# Altium footprint library heromap.PcbLib: 593 footprints (part 9 of 38)
Each footprint in its own frame and in the unit in brackets; x right, y up, seen from the top. Pads: shape width x height; smd on the part's side, far side on the other; paste and mask are expansions set on the pad; w line width, h text height; cw(c..) or ccw(c..) is an arc to the next point about the centre after c.
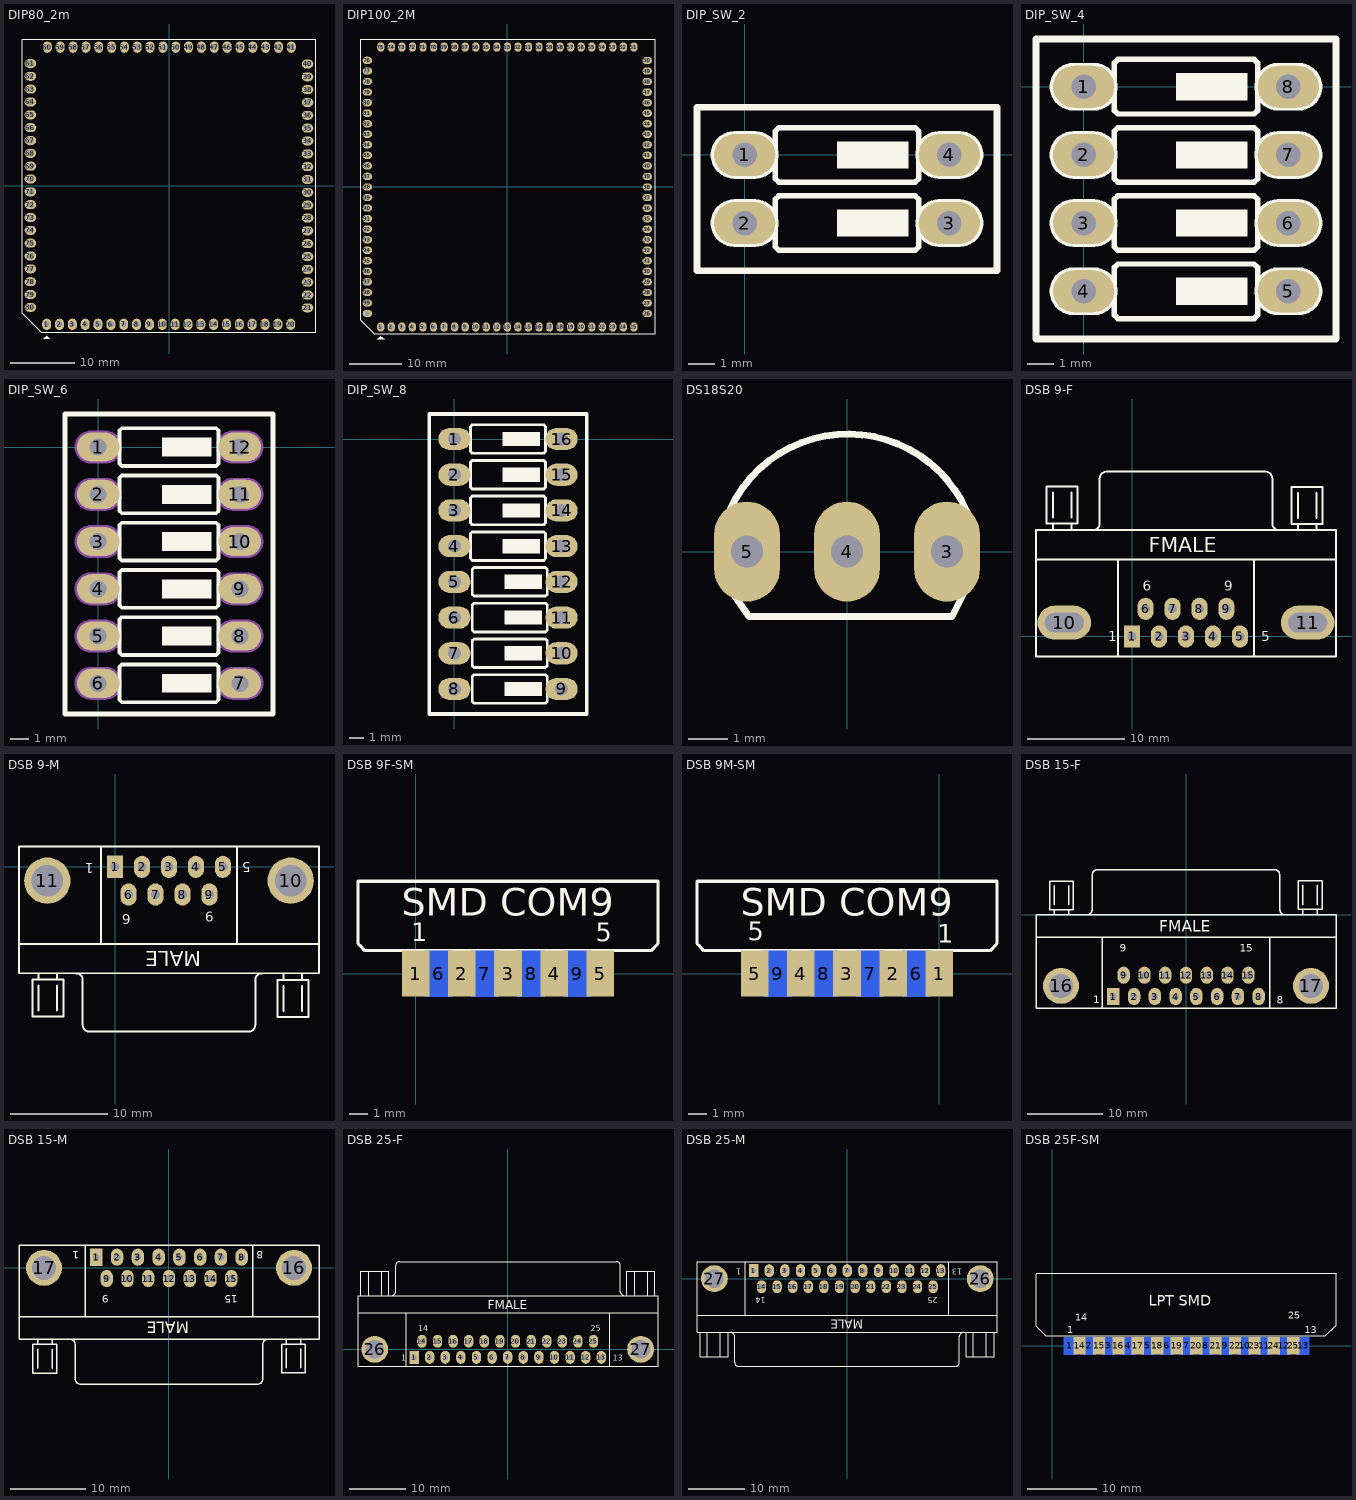
[diagram p8: the footprints below, top view; thin cyan lines are the x and y axes]

## DIP80_2m [mil] "DIP80, P - P 200"
pads (80):
  oval 55x70 hole 35: 1(-750,-850) 2(-671.26,-850) 3(-592.52,-850) 4(-513.78,-850) 5(-435.04,-850) 6(-356.3,-850) 7(-277.56,-850) 8(-198.82,-850) 9(-120.08,-850) 10(-41.34,-850) 11(37.4,-850) 12(116.14,-850) 13(194.88,-850) 14(273.62,-850) 15(352.36,-850) 16(431.1,-850) 17(509.84,-850) 18(588.58,-850) 19(667.32,-850) 20(746.06,-850) 41(750,850) 42(671.26,850) 43(592.52,850) 44(513.78,850) 45(435.04,850) 46(356.3,850) 47(277.56,850) 48(198.82,850) 49(120.08,850) 50(41.34,850) 51(-37.4,850) 52(-116.14,850) 53(-194.88,850) 54(-273.62,850) 55(-352.36,850) 56(-431.1,850) 57(-509.84,850) 58(-588.58,850) 59(-667.32,850) 60(-746.06,850)
  oval 70x55 hole 35: 21(850,-749) 22(850,-670.26) 23(850,-591.52) 24(850,-512.78) 25(850,-434.04) 26(850,-355.3) 27(850,-276.56) 28(850,-197.82) 29(850,-119.08) 30(850,-40.34) 31(850,38.4) 32(850,117.14) 33(850,195.88) 34(850,274.62) 35(850,353.36) 36(850,432.1) 37(850,510.84) 38(850,589.58) 39(850,668.32) 40(850,747.06) 61(-850,750) 62(-850,671.26) 63(-850,592.52) 64(-850,513.78) 65(-850,435.04) 66(-850,356.3) 67(-850,277.56) 68(-850,198.82) 69(-850,120.08) 70(-850,41.34) 71(-850,-37.4) 72(-850,-116.14) 73(-850,-194.88) 74(-850,-273.62) 75(-850,-352.36) 76(-850,-431.1) 77(-850,-509.84) 78(-850,-588.58) 79(-850,-667.32) 80(-850,-746.06)
Top Overlay:
  region: -770,-940 -750,-920 -730,-940
  lines w7: -900,-783 -783,-900 900,-900 900,900 -900,900 -900,-783

## DIP100_2M [mil] "DIP100 - P-P 2mm"
pads (100):
  oval 55x70 hole 35: 1(-945,-1045) 2(-866.26,-1045) 3(-787.52,-1045) 4(-708.78,-1045) 5(-630.04,-1045) 6(-551.3,-1045) 7(-472.56,-1045) 8(-393.82,-1045) 9(-315.08,-1045) 10(-236.34,-1045) 11(-157.6,-1045) 12(-78.86,-1045) 13(-0.12,-1045) 14(78.62,-1045) 15(157.36,-1045) 16(236.1,-1045) 17(314.84,-1045) 18(393.58,-1045) 19(472.32,-1045) 20(551.06,-1045) 21(629.8,-1045) 22(708.54,-1045) 23(787.28,-1045) 24(866.02,-1045) 25(944.76,-1045) 51(945,1045) 52(866.26,1045) 53(787.52,1045) 54(708.78,1045) 55(630.04,1045) 56(551.3,1045) 57(472.56,1045) 58(393.82,1045) 59(315.08,1045) 60(236.34,1045) 61(157.6,1045) 62(78.86,1045) 63(0.12,1045) 64(-78.62,1045) 65(-157.36,1045) 66(-236.1,1045) 67(-314.84,1045) 68(-393.58,1045) 69(-472.32,1045) 70(-551.06,1045) 71(-629.8,1045) 72(-708.54,1045) 73(-787.28,1045) 74(-866.02,1045) 75(-944.76,1045)
  oval 70x55 hole 35: 26(1045,-945) 27(1045,-866.26) 28(1045,-787.52) 29(1045,-708.78) 30(1045,-630.04) 31(1045,-551.3) 32(1045,-472.56) 33(1045,-393.82) 34(1045,-315.08) 35(1045,-236.34) 36(1045,-157.6) 37(1045,-78.86) 38(1045,-0.12) 39(1045,78.62) 40(1045,157.36) 41(1045,236.1) 42(1045,314.84) 43(1045,393.58) 44(1045,472.32) 45(1045,551.06) 46(1045,629.8) 47(1045,708.54) 48(1045,787.28) 49(1045,866.02) 50(1045,944.76) 76(-1045,945) 77(-1045,866.26) 78(-1045,787.52) 79(-1045,708.78) 80(-1045,630.04) 81(-1045,551.3) 82(-1045,472.56) 83(-1045,393.82) 84(-1045,315.08) 85(-1045,236.34) 86(-1045,157.6) 87(-1045,78.86) 88(-1045,0.12) 89(-1045,-78.62) 90(-1045,-157.36) 91(-1045,-236.1) 92(-1045,-314.84) 93(-1045,-393.58) 94(-1045,-472.32) 95(-1045,-551.06) 96(-1045,-629.8) 97(-1045,-708.54) 98(-1045,-787.28) 99(-1045,-866.02) 100(-1045,-944.76)
Top Overlay:
  region: -945,-1115 -975,-1135 -915,-1135
  lines w7: -1095,-995 -995,-1095 1105,-1095 1105,1105 -1095,1105 -1095,-995

## DIP_SW_2 [mil]
pads (4):
  oval 90x62 hole 36: 1(0,0) 2(0,-100) 3(300,-100) 4(300,0)
Top Overlay:
  rectangle: 135,-120 240,-80
  rectangle: 135,-20 240,20
  lines w8: 55,-140 245,-140 250,-140 255,-135 255,-65 250,-60 55,-60 ; 55,-40 245,-40 250,-40 255,-35 255,35 250,40 55,40 ; 65,-60 55,-60 ; 65,40 55,40 ; 100,-140 50,-140 45,-135 45,-65 50,-60 55,-60 ; 100,-40 50,-40 45,-35 45,35 50,40 55,40
  lines w10: -70,-170 370,-170 370,70 -70,70 -70,-170 ; -15,-130 cw(c-15,-100) -15,-70 15,-70 cw(c15,-100) 15,-130 -15,-130 ; -15,-30 cw(c-15,0) -15,30 15,30 cw(c15,0) 15,-30 -15,-30 ; 285,-130 cw(c285,-100) 285,-70 315,-70 cw(c315,-100) 315,-130 285,-130 ; 285,-30 cw(c285,0) 285,30 315,30 cw(c315,0) 315,-30 285,-30

## DIP_SW_4 [mil]
pads (8):
  oval 90x62 hole 36: 1(0,0) 2(0,-100) 3(0,-200) 4(0,-300) 5(300,-300) 6(300,-200) 7(300,-100) 8(300,0)
Top Overlay:
  rectangle: 135,-20 240,20
  rectangle: 135,-120 240,-80
  rectangle: 135,-220 240,-180
  rectangle: 135,-320 240,-280
  lines w8: 55,-340 245,-340 250,-340 255,-335 255,-265 250,-260 55,-260 ; 55,-240 245,-240 250,-240 255,-235 255,-165 250,-160 55,-160 ; 55,-140 245,-140 250,-140 255,-135 255,-65 250,-60 55,-60 ; 55,-40 245,-40 250,-40 255,-35 255,35 250,40 55,40 ; 65,-260 55,-260 ; 65,-160 55,-160 ; 65,-60 55,-60 ; 65,40 55,40 ; 100,-340 50,-340 45,-335 45,-265 50,-260 55,-260 ; 100,-240 50,-240 45,-235 45,-165 50,-160 55,-160 ; 100,-140 50,-140 45,-135 45,-65 50,-60 55,-60 ; 100,-40 50,-40 45,-35 45,35 50,40 55,40
  lines w10: -70,-370 -70,70 370,70 370,-370 -70,-370 ; -15,-330 cw(c-15,-300) -15,-270 15,-270 cw(c15,-300) 15,-330 -15,-330 ; -15,-230 cw(c-15,-200) -15,-170 15,-170 cw(c15,-200) 15,-230 -15,-230 ; -15,-130 cw(c-15,-100) -15,-70 15,-70 cw(c15,-100) 15,-130 -15,-130 ; -15,-30 cw(c-15,0) -15,30 15,30 cw(c15,0) 15,-30 -15,-30 ; 285,-330 cw(c285,-300) 285,-270 315,-270 cw(c315,-300) 315,-330 285,-330 ; 285,-230 cw(c285,-200) 285,-170 315,-170 cw(c315,-200) 315,-230 285,-230 ; 285,-130 cw(c285,-100) 285,-70 315,-70 cw(c315,-100) 315,-130 285,-130 ; 285,-30 cw(c285,0) 285,30 315,30 cw(c315,0) 315,-30 285,-30

## DIP_SW_6 [mil]
pads (12):
  oval 90x62 hole 36: 1(0,0) 2(0,-100) 3(0,-200) 4(0,-300) 5(0,-400) 6(0,-500) 7(300,-500) 8(300,-400) 9(300,-300) 10(300,-200) 11(300,-100) 12(300,0)
Top Overlay:
  rectangle: 135,-20 240,20
  rectangle: 135,-120 240,-80
  rectangle: 135,-220 240,-180
  rectangle: 135,-320 240,-280
  rectangle: 135,-420 240,-380
  rectangle: 135,-520 240,-480
  lines w8: 55,-540 245,-540 250,-540 255,-535 255,-465 250,-460 55,-460 ; 55,-440 245,-440 250,-440 255,-435 255,-365 250,-360 55,-360 ; 55,-340 245,-340 250,-340 255,-335 255,-265 250,-260 55,-260 ; 55,-240 245,-240 250,-240 255,-235 255,-165 250,-160 55,-160 ; 55,-140 245,-140 250,-140 255,-135 255,-65 250,-60 55,-60 ; 55,-40 245,-40 250,-40 255,-35 255,35 250,40 55,40 ; 65,-460 55,-460 ; 65,-360 55,-360 ; 65,-260 55,-260 ; 65,-160 55,-160 ; 65,-60 55,-60 ; 65,40 55,40 ; 100,-540 50,-540 45,-535 45,-465 50,-460 55,-460 ; 100,-440 50,-440 45,-435 45,-365 50,-360 55,-360 ; 100,-340 50,-340 45,-335 45,-265 50,-260 55,-260 ; 100,-240 50,-240 45,-235 45,-165 50,-160 55,-160 ; 100,-140 50,-140 45,-135 45,-65 50,-60 55,-60 ; 100,-40 50,-40 45,-35 45,35 50,40 55,40
  lines w10: -70,-565 -70,-370 -70,70 370,70 370,-370 370,-565 360,-565 -70,-565
Mechanical 3:
  lines w10: -15,-530 cw(c-15,-500) -15,-470 15,-470 cw(c15,-500) 15,-530 -15,-530 ; -15,-430 cw(c-15,-400) -15,-370 15,-370 cw(c15,-400) 15,-430 -15,-430 ; -15,-330 cw(c-15,-300) -15,-270 15,-270 cw(c15,-300) 15,-330 -15,-330 ; -15,-230 cw(c-15,-200) -15,-170 15,-170 cw(c15,-200) 15,-230 -15,-230 ; -15,-130 cw(c-15,-100) -15,-70 15,-70 cw(c15,-100) 15,-130 -15,-130 ; -15,-30 cw(c-15,0) -15,30 15,30 cw(c15,0) 15,-30 -15,-30 ; 285,-530 cw(c285,-500) 285,-470 315,-470 cw(c315,-500) 315,-530 285,-530 ; 285,-430 cw(c285,-400) 285,-370 315,-370 cw(c315,-400) 315,-430 285,-430 ; 285,-330 cw(c285,-300) 285,-270 315,-270 cw(c315,-300) 315,-330 285,-330 ; 285,-230 cw(c285,-200) 285,-170 315,-170 cw(c315,-200) 315,-230 285,-230 ; 285,-130 cw(c285,-100) 285,-70 315,-70 cw(c315,-100) 315,-130 285,-130 ; 285,-30 cw(c285,0) 285,30 315,30 cw(c315,0) 315,-30 285,-30

## DIP_SW_8 [mil]
pads (16):
  oval 90x62 hole 36: 1(0,0) 2(0,-100) 3(0,-200) 4(0,-300) 5(0,-400) 6(0,-500) 7(0,-600) 8(0,-700) 9(300,-700) 10(300,-600) 11(300,-500) 12(300,-400) 13(300,-300) 14(300,-200) 15(300,-100) 16(300,0)
Top Overlay:
  rectangle: 135,-320 240,-280
  rectangle: 135,-220 240,-180
  rectangle: 135,-120 240,-80
  rectangle: 135,-20 240,20
  rectangle: 140,-720 245,-680
  rectangle: 140,-620 245,-580
  rectangle: 140,-520 245,-480
  rectangle: 140,-420 245,-380
  lines w8: 55,-340 245,-340 250,-340 255,-335 255,-265 250,-260 55,-260 ; 55,-240 245,-240 250,-240 255,-235 255,-165 250,-160 55,-160 ; 55,-140 245,-140 250,-140 255,-135 255,-65 250,-60 55,-60 ; 55,-40 245,-40 250,-40 255,-35 255,35 250,40 55,40 ; 60,-740 250,-740 255,-740 260,-735 260,-665 255,-660 60,-660 ; 60,-640 250,-640 255,-640 260,-635 260,-565 255,-560 60,-560 ; 60,-540 250,-540 255,-540 260,-535 260,-465 255,-460 60,-460 ; 60,-440 250,-440 255,-440 260,-435 260,-365 255,-360 60,-360 ; 65,-260 55,-260 ; 65,-160 55,-160 ; 65,-60 55,-60 ; 65,40 55,40 ; 70,-660 60,-660 ; 70,-560 60,-560 ; 70,-460 60,-460 ; 70,-360 60,-360 ; 100,-340 50,-340 45,-335 45,-265 50,-260 55,-260 ; 100,-240 50,-240 45,-235 45,-165 50,-160 55,-160 ; 100,-140 50,-140 45,-135 45,-65 50,-60 55,-60 ; 100,-40 50,-40 45,-35 45,35 50,40 55,40 ; 105,-740 55,-740 50,-735 50,-665 55,-660 60,-660 ; 105,-640 55,-640 50,-635 50,-565 55,-560 60,-560 ; 105,-540 55,-540 50,-535 50,-465 55,-460 60,-460 ; 105,-440 55,-440 50,-435 50,-365 55,-360 60,-360
  lines w10: -70,-370 -70,70 370,70 370,-370 ; -70,-330 -70,-770 370,-770 370,-330

## DS18S20 [mil] "TO-92"
height 200
pads (3):
  oval 66x100 hole 32: 3(100,0) 4(0,0) 5(-100,0)
Top Overlay:
  lines w7: -116.52,43.21 cw(c0.97,-12.43) 119.94,39.97 ; -115.34,-40.24 -98,-65 105,-65 118,-39

## DSB 9-F [mil] "COM FMALE - D Subminiature; 9 Position; Right Angle; Pitch 1.385 mm"
height 501.97
pads (11):
  rect 65x90 hole 35: 1(0,0)
  oval 65x90 hole 35: 2(109.06,0) 3(218.11,0) 4(327.17,0) 5(436.22,0) 6(54.53,111.81) 7(163.58,111.81) 8(272.64,111.81) 9(381.69,111.81)
  oval 216.54x137.8 hole 78.74 slot 157.48 at 0 deg: 10(-273.82,55.91) 11(710.04,55.91)
Top Overlay:
  lines w7.87: -388.19,311.81 824.41,311.81 ; -158.27,430.12 ccw(c-158.27,457.48) -130.91,457.48 -130.91,638.58 ; -130.71,638.78 cw(c-103.35,638.78) -103.35,666.14 539.57,666.14 cw(c539.57,638.78) 566.93,638.78 ; -57.48,-80.09 -57.48,311.81 ; 493.7,-78.09 493.7,311.81 ; 567.13,638.58 567.13,457.48 ccw(c594.49,457.48) 594.49,430.12 ; -388.19,-80.09 -388.19,429.92 824.41,429.92 824.41,-80.09 -388.19,-80.09
  lines w8: -319.89,431.92 -319.89,456.92 ; -319.89,481.92 -319.89,581.92 ; -244.89,431.92 -244.89,456.92 ; -244.89,481.92 -244.89,581.92 ; 670.11,429.92 670.11,454.92 ; 670.11,479.92 670.11,579.92 ; 745.11,429.92 745.11,454.92 ; 745.11,479.92 745.11,579.92 ; -344.89,456.92 -219.89,456.92 -219.89,606.92 -344.89,606.92 -344.89,456.92 ; 645.11,454.92 770.11,454.92 770.11,604.92 645.11,604.92 645.11,454.92
  text "1" at -96.89,-19.09 h40
  text "5" at 523.11,-19.09 h40
  text "9" at 373.11,185.91 h40
  text "6" at 43.11,185.91 h40
  text "FMALE" at 68.11,340.91 h60
3D body "SW3dPS-9-PIN_DSUB-1.STEP": height 492.57, standoff -126.43, extent -388.39,-80.09 824.61,670.9

## DSB 9-M [mil] "COM MALE D Subminiature; 9 Position; Right Angle; Pitch 1.385 mm"
height 501.97
pads (11):
  rect 65x90 hole 35: 1(0,0)
  oval 65x90 hole 35: 2(109.06,0) 3(218.11,0) 4(327.17,0) 5(436.22,0) 6(54.53,-111.81) 7(163.58,-111.81) 8(272.64,-111.81) 9(381.69,-111.81)
  round 187.4 hole 128.35: 10(710.04,-55.91) 11(-273.82,-55.91)
Top Overlay:
  lines w7.87: -388.19,-311.81 824.41,-311.81 ; -158.27,-430.12 cw(c-158.27,-457.48) -130.91,-457.48 -130.91,-638.58 ; -130.71,-638.78 ccw(c-103.35,-638.78) -103.35,-666.14 539.57,-666.14 ccw(c539.57,-638.78) 566.93,-638.78 ; -57.48,-311.81 -57.48,83.09 ; 493.7,-311.81 493.7,81.09 ; 567.13,-638.58 567.13,-457.48 cw(c594.49,-457.48) 594.49,-430.12 ; -388.19,-429.92 -388.19,83.09 824.41,83.09 824.41,-429.92 -388.19,-429.92
  lines w8: -308.89,-579.92 -308.89,-479.92 ; -308.89,-454.92 -308.89,-429.92 ; -233.89,-579.92 -233.89,-479.92 ; -233.89,-454.92 -233.89,-429.92 ; 681.11,-581.92 681.11,-481.92 ; 681.11,-456.92 681.11,-431.92 ; 756.11,-581.92 756.11,-481.92 ; 756.11,-456.92 756.11,-431.92 ; -333.89,-604.92 -333.89,-454.92 -208.89,-454.92 -208.89,-604.92 -333.89,-604.92 ; 656.11,-606.92 656.11,-456.92 781.11,-456.92 781.11,-606.92 656.11,-606.92
  text "MALE" at 348.11,-340.91 h60
  text "1" at -86.89,14.09 h40
  text "5" at 548.11,19.09 h40
  text "9" at 398.11,-180.91 h40
  text "6" at 63.11,-190.91 h40
3D body "SW3dPS-9-PIN_DSUB.STEP": height 494.93, standoff -124.07, extent -391.89,-694.91 824.11,80.09

## DSB 9F-SM [mil] "Com 9 chan SMD,F"
pads (11):
  rect 60x100 smd: 1(0,0) 2(100,0) 3(200,0) 4(300,0) 5(400,0)
  rect 60x100 smd far side: 6(50,0) 7(150,0) 8(250,0) 9(350,0)
  round 1 all layers, no hole: 10(21,144) 11(152,144)
Top Overlay:
  lines w7: -125,65 -125,100 -125,200 525,200 525,65 510,50 435,50 -110,50 -120,60 -125,65
  text "1" at -10,70 h40
  text "5" at 390,70 h40
  text "SMD COM9" at -30,125 h60

## DSB 9M-SM [mil] "Com 9 chan SMD,F"
pads (11):
  rect 60x100 smd: 1(0,0) 2(-100,0) 3(-200,0) 4(-300,0) 5(-400,0)
  rect 60x100 smd far side: 6(-50,0) 7(-150,0) 8(-250,0) 9(-350,0)
  round 1 all layers, no hole: 10(-379,144) 11(-248,144)
Top Overlay:
  lines w7: -525,65 -525,100 -525,200 125,200 125,65 110,50 35,50 -510,50 -520,60 -525,65
  text "1" at -4,67 h40
  text "5" at -415,72 h40
  text "SMD COM9" at -430,125 h60

## DSB 15-F [mil] "COM FMALE - D Subminiature; 15 Position; Right Angle; Pitch 1.385 mm"
height 501.97
pads (17):
  rect 65x90 hole 35: 1(-381.69,-429.92)
  oval 65x90 hole 35: 2(-272.64,-429.92) 3(-163.58,-429.92) 4(-54.53,-429.92) 5(54.53,-429.92) 6(163.58,-429.92) 7(272.64,-429.92) 8(381.69,-429.92) 9(-327.17,-318.11) 10(-218.11,-318.11) 11(-109.06,-318.11) 12(0,-318.11) 13(109.06,-318.11) 14(218.11,-318.11) 15(327.17,-318.11)
  round 188.98 hole 125.2: 16(-655.91,-374.02) 17(655.91,-374.02)
Top Overlay:
  lines w7.87: -787.4,-118.11 787.4,-118.11 ; -519.49,0.2 ccw(c-519.49,27.56) -492.13,27.56 -492.13,208.66 ; -491.93,208.86 cw(c-464.57,208.86) -464.57,236.22 464.57,236.22 cw(c464.57,208.86) 491.93,208.86 ; -438.58,-492.13 -438.58,-118.11 ; 438.58,-492.13 438.58,-118.11 ; 492.13,208.66 492.13,27.56 ccw(c519.49,27.56) 519.49,0.2 ; -787.4,-492.13 -787.4,0 787.4,0 787.4,-492.13 -787.4,-492.13
  lines w8: -691,1 -691,26 ; -691,51 -691,151 ; -616,1 -616,26 ; -616,51 -616,151 ; 614,3 614,28 ; 614,53 614,153 ; 689,3 689,28 ; 689,53 689,153 ; -716,26 -716,176 -591,176 -591,26 -716,26 ; 589,28 589,178 714,178 714,28 589,28
  text "1" at -488,-466 h40
  text "8" at 476,-469 h40
  text "15" at 282.87,-195.87 h40
  text "9" at -346.85,-195.87 h40
  text "FMALE" at -140,-90 h60

## DSB 15-M [mil] "LPT15 MALE - D Subminiature; 15 Position; Right Angle; Pitch 1.385 mm"
height 501.97
pads (17):
  rect 65x90 hole 35: 1(-381.69,55.91)
  oval 65x90 hole 35: 2(-272.64,55.9) 3(-163.58,55.9) 4(-54.53,55.9) 5(54.53,55.9) 6(163.58,55.9) 7(272.64,55.9) 8(381.69,55.9) 9(-327.16,-55.91) 10(-218.11,-55.91) 11(-109.05,-55.91) 12(0,-55.91) 13(109.06,-55.91) 14(218.11,-55.91) 15(327.17,-55.91)
  round 188.98 hole 125.2: 16(655.91,0) 17(-655.91,0)
Top Overlay:
  lines w7.87: -787.4,-255.91 787.4,-255.91 ; -519.49,-374.21 cw(c-519.49,-401.58) -492.13,-401.58 -492.13,-582.68 ; -491.93,-582.87 ccw(c-464.57,-582.87) -464.57,-610.24 464.57,-610.24 ccw(c464.57,-582.87) 491.93,-582.87 ; -438.58,-255.91 -438.58,118.11 ; 438.58,-255.91 438.58,118.11 ; 492.13,-582.68 492.13,-401.58 cw(c519.49,-401.58) 519.49,-374.21 ; -787.4,-374.02 -787.4,118.11 787.4,118.11 787.4,-374.02 -787.4,-374.02
  lines w8: -689,-527.02 -689,-427.02 ; -689,-402.02 -689,-377.02 ; -614,-527.02 -614,-427.02 ; -614,-402.02 -614,-377.02 ; 616,-525.02 616,-425.02 ; 616,-400.02 616,-375.02 ; 691,-525.02 691,-425.02 ; 691,-400.02 691,-375.02 ; -714,-552.02 -589,-552.02 -589,-402.02 -714,-402.02 -714,-552.02 ; 591,-550.02 716,-550.02 716,-400.02 591,-400.02 591,-550.02
  text "1" at -470,85.98 h40
  text "8" at 495,85.98 h40
  text "15" at 360,-144.02 h40
  text "9" at -315,-144.02 h40
  text "MALE" at 105,-284.02 h60

## DSB 25-F [mil] "LPT FMALE - D Subminiature; 25 Position; Right Angle; Pitch 1.385 mm"
height 509.06
pads (27):
  rect 65x90 hole 35: 1(-652.2,-55.91)
  oval 65x90 hole 35: 2(-543.5,-55.91) 3(-434.8,-55.91) 4(-326.1,-55.91) 5(-217.4,-55.91) 6(-108.7,-55.91) 7(0,-55.91) 8(108.7,-55.91) 9(217.4,-55.91) 10(326.1,-55.91) 11(434.8,-55.91) 12(543.5,-55.91) 13(652.2,-55.91) 14(-597.85,55.91) 15(-489.15,55.91) 16(-380.45,55.91) 17(-271.75,55.91) 18(-163.05,55.91) 19(-54.35,55.91) 20(54.35,55.91) 21(163.05,55.91) 22(271.75,55.91) 23(380.45,55.91) 24(489.15,55.91) 25(597.85,55.91)
  round 187.4 hole 128.35: 26(-926.22,0) 27(926.22,0)
Top Overlay:
  lines w7.87: -1043.15,255.91 1047.4,255.91 ; -808.7,374.21 ccw(c-808.7,401.57) -781.34,401.57 -781.34,582.68 ; -781.14,582.87 cw(c-753.78,582.87) -753.78,610.24 758.03,610.24 cw(c758.03,582.87) 785.39,582.87 ; -706.54,-118.11 -706.54,255.91 ; 710.79,-118.11 710.79,255.91 ; 785.59,582.68 785.59,401.57 ccw(c812.95,401.57) 812.95,374.21 ; -1043.15,-118.11 1047.4,-118.11 1047.4,374.02 -1043.15,374.02 -1043.15,-118.11
  lines w8: -1023,375.02 -1023,544.02 -828,544.02 -828,375.02 ; -968,375.02 -968,544.02 ; -878,375.02 -878,544.02 ; 830,375.02 830,544.02 1025,544.02 1025,375.02 ; 885,375.02 885,544.02 ; 975,375.02 975,544.02
  text "FMALE" at -140,279.02 h60
  text "1" at -743,-79.98 h40
  text "13" at 733,-79.98 h40
  text "14" at -624,125.02 h40
  text "25" at 578,125.02 h40

## DSB 25-M [mil] "LPT MALE D Subminiature; 25 Position; Right Angle; Pitch 1.385 mm"
height 509.06
pads (27):
  rect 65x90 hole 35: 1(-652.2,55.91)
  oval 65x90 hole 35: 2(-543.5,55.91) 3(-434.8,55.91) 4(-326.1,55.91) 5(-217.4,55.91) 6(-108.7,55.91) 7(0,55.91) 8(108.7,55.91) 9(217.4,55.91) 10(326.1,55.91) 11(434.8,55.91) 12(543.5,55.91) 13(652.21,55.91) 14(-597.85,-55.91) 15(-489.15,-55.91) 16(-380.45,-55.91) 17(-271.75,-55.91) 18(-163.05,-55.91) 19(-54.35,-55.91) 20(54.35,-55.91) 21(163.05,-55.91) 22(271.75,-55.91) 23(380.45,-55.91) 24(489.15,-55.91) 25(597.85,-55.91)
  round 187.4 hole 128.35: 26(926.22,0) 27(-926.22,0)
Top Overlay:
  lines w7.87: -1047.4,-255.91 1043.15,-255.91 ; -812.95,-374.21 cw(c-812.95,-401.57) -785.59,-401.57 -785.59,-582.68 ; -785.39,-582.87 ccw(c-758.03,-582.87) -758.03,-610.24 753.78,-610.24 ccw(c753.78,-582.87) 781.14,-582.87 ; -710.79,-255.91 -710.79,118.11 ; 706.54,-255.91 706.54,118.11 ; 781.34,-582.68 781.34,-401.57 cw(c808.7,-401.57) 808.7,-374.21 ; -1047.4,-374.02 -1047.4,118.11 1043.15,118.11 1043.15,-374.02 -1047.4,-374.02
  lines w8: -1025,-375.02 -1025,-544.02 -830,-544.02 -830,-375.02 ; -975,-544.02 -975,-375.02 ; -885,-544.02 -885,-375.02 ; 828,-375.02 828,-544.02 1023,-544.02 1023,-375.02 ; 878,-544.02 878,-375.02 ; 968,-544.02 968,-375.02
  text "25" at 630,-129.02 h40
  text "14" at -570,-129.02 h40
  text "13" at 800,70.98 h40
  text "1" at -740,70.98 h40
  text "MALE" at 110,-285 h60

## DSB 25F-SM [mil] "25 pin, connector LPT"
height 200
pads (27):
  rect 70x100 smd far side: 1(100,0) 2(211,0) 3(322,0) 4(433,0) 5(544,0) 6(655,0) 7(766,0) 8(877,0) 9(988,0) 10(1099,0) 11(1210,0) 12(1321,0) 13(1432,0)
  rect 70x100 smd: 14(155,0) 15(266,0) 16(377,0) 17(488,0) 18(599,0) 19(710,0) 20(821,0) 21(932,0) 22(1043,0) 23(1154,0) 24(1265,0) 25(1376,0)
  round 1 all layers, no hole: 26(760,80) 27(870,80)
Top Overlay:
  lines w7: -94,112 -94,410 -89,415 1551,415 1618,415 1620,413 1620,119 1558,57 -39,57 -94,112
  text "LPT SMD" at 550,230 h60
  text "25" at 1346,155 h40
  text "14" at 131,143 h40
  text "1" at 85,73 h40
  text "13" at 1441,73 h40